# Altium footprint library Lib_001.PcbLib: 429 footprints (part 28 of 28)
Each footprint in its own frame and in the unit in brackets; x right, y up, seen from the top. Pads: shape width x height; smd on the part's side, far side on the other; paste and mask are expansions set on the pad; w line width, h text height; cw(c..) or ccw(c..) is an arc to the next point about the centre after c.
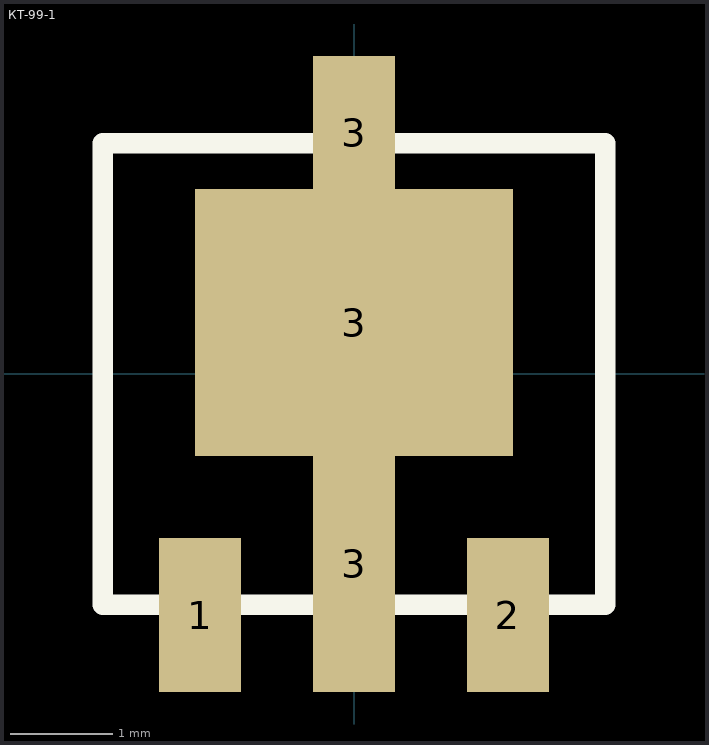
[diagram p27: the footprint, top view; thin cyan lines are the x and y axes]

## КТ-99-1 [mm] "4601.3-1"
pads (5):
  rect 0.8x1.5 smd: 1(-1.5,-2.35) 2(1.5,-2.35) 3(0,2.35)
  rect 0.8x2.5 smd: 3(0,-1.85)
  rect 3.1x2.6 smd: 3(0,0.5)
Top Overlay:
  lines w0.2: -2.45,-2.25 -2.45,2.25 2.45,2.25 2.45,-2.25 -2.45,-2.25
3D body "KT-99-1.step": height 1.74, standoff 0, extent -2.3,-2.6 2.3,2.6